# Altium footprint library CONN_DSUB.PcbLib: 35 footprints (part 2 of 3)
Each footprint in its own frame and in the unit in brackets; x right, y up, seen from the top. Pads: shape width x height; smd on the part's side, far side on the other; paste and mask are expansions set on the pad; w line width, h text height; cw(c..) or ccw(c..) is an arc to the next point about the centre after c.
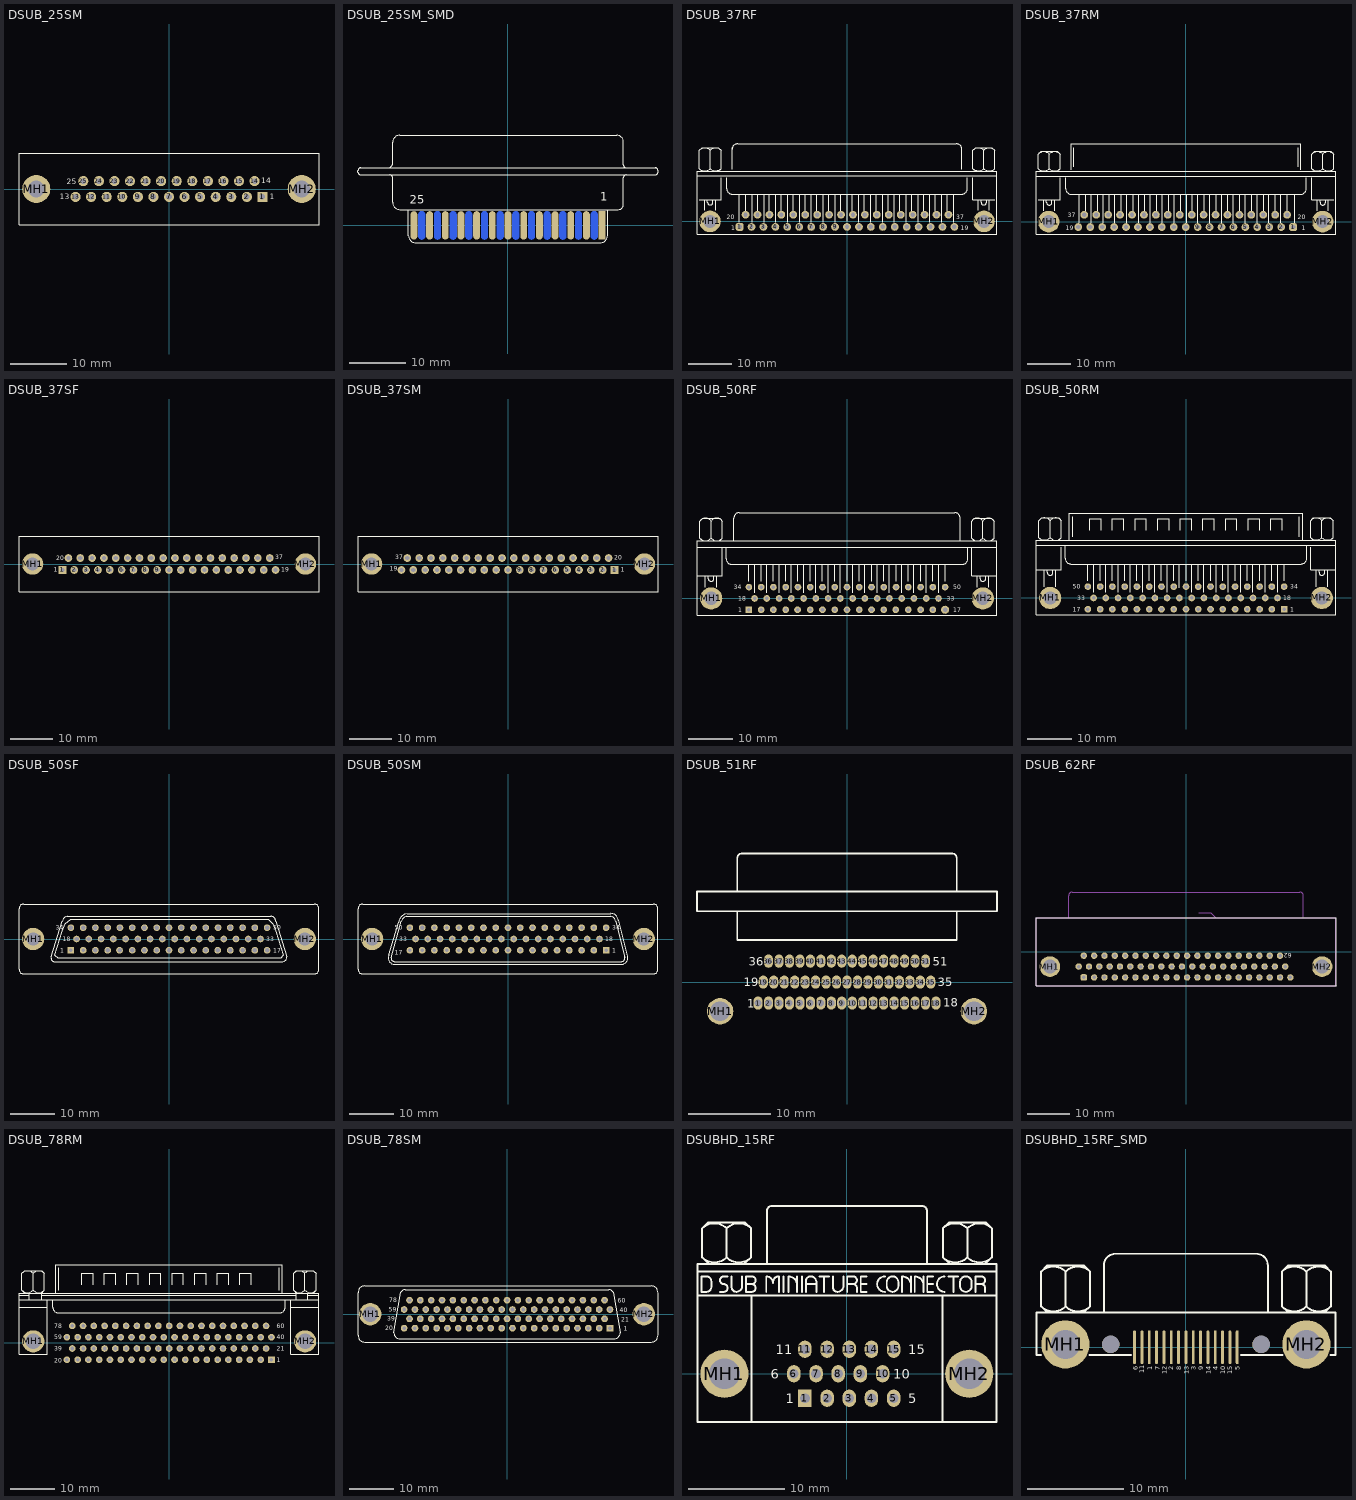
[diagram p1: the footprints below, top view; thin cyan lines are the x and y axes]

## DSUB_25SM [mm] "CONN, DSUB MINIATURE, 25PIN, STRAIGHT, MALE"
pads (27):
  rect 1.8x1.8 hole 1 mask+0.1: 1(16.612,-1.397)
  round 1.8 hole 1 mask+0.1: 2(13.843,-1.397) 3(11.074,-1.397) 4(8.306,-1.397) 5(5.537,-1.397) 6(2.769,-1.397) 7(0,-1.397) 8(-2.769,-1.397) 9(-5.537,-1.397) 10(-8.306,-1.397) 11(-11.074,-1.397) 12(-13.843,-1.397) 13(-16.612,-1.397) 14(15.215,1.397) 15(12.446,1.397) 16(9.677,1.397) 17(6.909,1.397) 18(4.14,1.397) 19(1.372,1.397) 20(-1.397,1.397) 21(-4.166,1.397) 22(-6.934,1.397) 23(-9.703,1.397) 24(-12.471,1.397) 25(-15.24,1.397)
  round 5 hole 3: MH1(-23.597,0) MH2(23.597,0)
Top Overlay:
  lines w0.2: -26.67,-6.35 26.67,-6.35 26.67,6.35 -26.67,6.35 -26.67,-6.35
  text "25" at -18.186,0.889 h1
  text "13" at -19.456,-1.778 h1
  text "1" at 17.882,-1.778 h1
  text "14" at 16.358,1.016 h1
3D body "SW3dPS-DB25plug_straight.STEP": height 12.84, standoff -4.46, extent -26.535,-6.274 26.5,6.274

## DSUB_25SM_SMD [mm] "CONN, DSUB MINIATURE, 25PIN, MALE, STRAIGHT, SURFACE MOUNT"
pads (25):
  rect 1.2x5 smd mask+0.1: 1(16.566,0)
  oval 1.2x5 smd mask+0.1: 2(13.805,0) 3(11.044,0) 4(8.283,0) 5(5.522,0) 6(2.761,0) 7(0,0) 8(-2.761,0) 9(-5.522,0) 10(-8.283,0) 11(-11.044,0) 12(-13.805,0) 13(-16.566,0)
  oval 1.2x5 smd far side mask+0.1: 14(15.186,0) 15(12.425,0) 16(9.664,0) 17(6.903,0) 18(4.142,0) 19(1.381,0) 20(-1.381,0) 21(-4.142,0) 22(-6.902,0) 23(-9.663,0) 24(-12.424,0) 25(-15.185,0)
Top Overlay:
  lines w0.2: -21.59,10.16 22.86,10.16 ; -21.336,8.89 21.59,8.89 ; -17.526,2.794 -17.526,-1.778 ccw(c-16.256,-1.778) -16.256,-3.048 16.256,-3.048 ccw(c16.256,-1.778) 17.526,-1.778 17.526,2.794 ; -26.416,9.398 ccw(c-25.908,9.398) -25.908,8.89 -20.828,8.89 cw(c-20.828,8.382) -20.32,8.382 -20.32,4.064 ccw(c-19.05,4.064) -19.05,2.794 19.453,2.794 ccw(c19.453,3.661) 20.32,3.661 20.32,8.382 cw(c20.828,8.382) 20.828,8.89 25.908,8.89 ccw(c25.908,9.398) 26.416,9.398 26.416,9.652 ccw(c25.908,9.652) 25.908,10.16 20.828,10.16 cw(c20.828,10.668) 20.32,10.668 20.32,14.732 ccw(c19.177,14.732) 19.177,15.875 -19.05,15.875 ccw(c-19.05,14.605) -20.32,14.605 -20.32,10.922 cw(c-21.082,10.922) -21.082,10.16 -25.908,10.16 ccw(c-25.908,9.652) -26.416,9.652 -26.416,9.398
  text "1" at 16.256,4.318 h1.5
  text "25" at -17.272,3.81 h1.5
3D body "SW3dPS-DB25plug_straight.STEP": height 5.51, standoff -7.04, extent -26.518,-1.422 26.518,15.875

## DSUB_37RF [mm] "CONN, DSUB MINIATURE, CONN, DSUB MINIATURE, 37PIN, R/A, FEMALE"
pads (39):
  rrect50% 1.8x1.8 hole 1 mask+0.1: 1(-24.93,-1.27)
  round 1.8 hole 1 mask+0.1: 2(-22.16,-1.27) 3(-19.39,-1.27) 4(-16.62,-1.27) 5(-13.85,-1.27) 6(-11.08,-1.27) 7(-8.31,-1.27) 8(-5.54,-1.27) 9(-2.77,-1.27) 10(0,-1.27) 11(2.77,-1.27) 12(5.54,-1.27) 13(8.31,-1.27) 14(11.08,-1.27) 15(13.85,-1.27) 16(16.62,-1.27) 17(19.39,-1.27) 18(22.16,-1.27) 19(24.93,-1.27) 20(-23.545,1.57) 21(-20.775,1.57) 22(-18.005,1.57) 23(-15.235,1.57) 24(-12.465,1.57) 25(-9.695,1.57) 26(-6.925,1.57) 27(-4.155,1.57) 28(-1.385,1.57) 29(1.385,1.57) 30(4.155,1.57) 31(6.925,1.57) 32(9.695,1.57) 33(12.465,1.57) 34(15.235,1.57) 35(18.005,1.57) 36(20.775,1.57) 37(23.545,1.57)
  round 5 hole 3: MH1(-31.8,0) MH2(31.8,0)
Top Overlay:
  lines w0.2: -34.713,10.583 34.713,10.583 ; -34.292,12.274 ccw(c-33.02,13.547) -31.748,12.274 ; -34.292,16.512 cw(c-33.02,15.24) -31.748,16.512 ; -34.29,5.08 -29.21,5.08 -29.21,10.16 ; -33.655,11.642 -34.29,12.277 -34.29,16.51 -33.655,17.145 -29.845,17.145 -29.21,16.51 -29.21,12.277 -29.845,11.642 ; -33.02,2.54 -33.02,5.08 ; -32.385,5.08 -32.385,4.445 ccw(c-31.75,4.445) -31.115,4.445 -31.115,5.08 ; -31.752,12.274 ccw(c-30.48,13.547) -29.208,12.274 ; -31.752,16.512 cw(c-30.48,15.24) -29.208,16.512 ; -31.75,12.277 -31.75,15.875 -31.75,16.51 ; -30.48,2.54 -30.48,5.08 ; -27.94,10.16 -27.94,7.62 ccw(c-26.67,7.62) -26.67,6.35 26.67,6.35 ccw(c26.67,7.62) 27.94,7.62 27.94,10.16 ; -26.67,12.065 -26.67,17.145 ; -26.67,16.745 cw(c-25.4,16.745) -25.4,18.015 25.4,18.015 cw(c25.4,16.745) 26.67,16.745 ; -24.977,-0.212 -24.977,6.35 ; -23.495,2.328 -23.495,6.35 ; -22.013,-0.212 -22.013,6.138 -22.013,6.35 ; -20.743,2.328 -20.743,6.35 ; -19.262,-0.212 -19.262,6.138 -19.262,6.35 ; -17.992,2.328 -17.992,6.35 ; -16.51,-0.212 -16.51,6.138 -16.51,6.35 ; -15.24,2.328 -15.24,6.35 ; -13.758,-0.212 -13.758,6.138 -13.758,6.35 ; -12.488,2.328 -12.488,6.35 ; -11.007,-0.212 -11.007,6.138 -11.007,6.35 ; -9.737,2.328 -9.737,6.35 ; -8.255,-0.212 -8.255,6.138 -8.255,6.35 ; -6.985,2.328 -6.985,6.35 ; -5.503,-0.212 -5.503,6.138 -5.503,6.35 ; -4.233,2.328 -4.233,6.35 ; -2.752,-0.212 -2.752,6.138 -2.752,6.35 ; -1.482,2.328 -1.482,6.35 ; 0,0 0,6.35 ; 1.27,2.328 1.27,6.35 ; 2.752,-0.212 2.752,6.35 ; 4.022,2.328 4.022,6.35 ; 5.503,-0.212 5.503,6.138 5.503,6.35 ; 6.773,2.328 6.773,6.35 ; 8.255,-0.212 8.255,6.138 8.255,6.35 ; 9.525,2.328 9.525,6.35 ; 11.007,-0.212 11.007,6.138 11.007,6.35 ; 12.277,2.328 12.277,6.35 ; 13.758,-0.212 13.758,6.138 13.758,6.35 ; 15.028,2.328 15.028,6.35 ; 16.51,-0.212 16.51,6.138 16.51,6.35 ; 17.78,2.328 17.78,6.35 ; 19.262,-0.212 19.262,6.138 19.262,6.35 ; 20.532,2.328 20.532,6.35 ; 22.013,-0.212 22.013,6.138 22.013,6.35 ; 23.283,2.328 23.283,6.35 ; 24.765,-0.212 24.765,6.138 24.765,6.35 ; 26.67,12.065 26.67,17.145 ; 29.208,12.274 ccw(c30.48,13.547) 31.752,12.274 ; 29.208,16.512 cw(c30.48,15.24) 31.752,16.512 ; 29.21,10.16 29.21,5.08 34.29,5.08 ; 29.845,11.642 29.21,12.277 29.21,16.51 29.845,17.145 33.655,17.145 34.29,16.51 34.29,12.277 33.655,11.642 ; 30.48,2.54 30.48,5.08 ; 31.115,5.08 31.115,4.445 ccw(c31.75,4.445) 32.385,4.445 32.385,5.08 ; 31.748,12.274 ccw(c33.02,13.547) 34.292,12.274 ; 31.748,16.512 cw(c33.02,15.24) 34.292,16.512 ; 31.75,12.277 31.75,15.875 31.75,16.51 ; 33.02,2.54 33.02,5.08 ; -34.713,-2.963 34.713,-2.963 34.713,11.642 -34.713,11.642 -34.713,-2.963
  text "19" at 26.416,-2.032 h1
  text "37" at 25.4,0.508 h1
  text "20" at -27.94,0.508 h1
  text "1" at -26.924,-2.032 h1
3D body "connector_a-dSUB37RF_a_kg-t1.stp": height 12.57, standoff -4.3, extent -34.66,-2.9 34.66,17.9

## DSUB_37RM [mm] "CONN, DSUB MINIATURE, 37PIN, R/A, MALE"
pads (39):
  rrect50% 1.8x1.8 hole 1 mask+0.1: 1(24.93,-1.27)
  round 1.8 hole 1 mask+0.1: 2(22.16,-1.27) 3(19.39,-1.27) 4(16.62,-1.27) 5(13.85,-1.27) 6(11.08,-1.27) 7(8.31,-1.27) 8(5.54,-1.27) 9(2.77,-1.27) 10(0,-1.27) 11(-2.77,-1.27) 12(-5.54,-1.27) 13(-8.31,-1.27) 14(-11.08,-1.27) 15(-13.85,-1.27) 16(-16.62,-1.27) 17(-19.39,-1.27) 18(-22.16,-1.27) 19(-24.93,-1.27) 20(23.545,1.57) 21(20.775,1.57) 22(18.005,1.57) 23(15.235,1.57) 24(12.465,1.57) 25(9.695,1.57) 26(6.925,1.57) 27(4.155,1.57) 28(1.385,1.57) 29(-1.385,1.57) 30(-4.155,1.57) 31(-6.925,1.57) 32(-9.695,1.57) 33(-12.465,1.57) 34(-15.235,1.57) 35(-18.005,1.57) 36(-20.775,1.57) 37(-23.545,1.57)
  round 5 hole 3: MH1(-31.8,0) MH2(31.8,0)
Top Overlay:
  lines w0.2: -34.646,10.583 34.781,10.583 ; -34.224,12.274 ccw(c-32.952,13.547) -31.68,12.274 ; -34.224,15.666 cw(c-32.952,14.393) -31.68,15.666 ; -34.222,5.08 -29.142,5.08 -29.142,10.16 ; -33.587,11.642 -34.222,12.277 -34.222,12.488 -34.222,15.663 -33.587,16.298 -29.777,16.298 -29.142,15.663 -29.142,15.452 -29.142,12.277 -29.777,11.642 ; -32.952,2.54 -32.952,5.08 ; -32.317,5.08 -32.317,4.445 ccw(c-31.682,4.445) -31.047,4.445 -31.047,5.08 ; -31.684,12.274 ccw(c-30.412,13.547) -29.14,12.274 ; -31.684,15.666 cw(c-30.412,14.393) -29.14,15.666 ; -31.682,12.277 -31.682,15.663 ; -30.412,2.54 -30.412,5.08 ; -27.872,10.16 -27.872,7.62 ccw(c-26.602,7.62) -26.602,6.35 26.738,6.35 ccw(c26.738,7.62) 28.008,7.62 28.008,10.16 ; -26.602,12.065 -26.602,18.1 26.738,18.1 26.738,12.065 ; -25.967,12.7 -25.967,17.145 ; -24.697,-0.212 -24.697,6.35 ; -23.216,2.328 -23.216,6.35 ; -21.946,-0.212 -21.946,6.35 ; -20.464,2.328 -20.464,6.35 ; -19.194,-0.212 -19.194,6.35 ; -17.712,2.328 -17.712,6.35 ; -16.442,-0.212 -16.442,6.35 ; -14.961,2.328 -14.961,6.35 ; -13.691,-0.212 -13.691,6.35 ; -12.209,2.328 -12.209,6.35 ; -10.939,-0.212 -10.939,6.35 ; -9.457,2.328 -9.457,6.35 ; -8.187,-0.212 -8.187,6.35 ; -6.706,2.328 -6.706,6.35 ; -5.436,-0.212 -5.436,6.35 ; -3.954,2.328 -3.954,6.35 ; -2.684,-0.212 -2.684,6.35 ; -1.202,2.328 -1.202,6.35 ; 0.279,-0.212 0.279,6.35 ; 1.549,2.328 1.549,6.35 ; 2.819,-0.212 2.819,6.35 ; 4.301,2.328 4.301,6.35 ; 5.571,-0.212 5.571,6.35 ; 7.053,2.328 7.053,6.35 ; 8.323,-0.212 8.323,6.35 ; 9.804,2.328 9.804,6.35 ; 11.074,-0.212 11.074,6.35 ; 12.556,2.328 12.556,6.35 ; 13.826,-0.212 13.826,6.35 ; 15.308,2.328 15.308,6.35 ; 16.578,-0.212 16.578,6.35 ; 18.059,2.328 18.059,6.35 ; 19.329,-0.212 19.329,6.35 ; 20.811,2.328 20.811,6.35 ; 22.081,-0.212 22.081,6.35 ; 23.563,2.328 23.563,6.35 ; 25.256,-0.212 25.256,6.35 ; 26.103,12.7 26.103,17.145 ; 29.276,12.274 ccw(c30.548,13.547) 31.82,12.274 ; 29.276,15.666 cw(c30.548,14.393) 31.82,15.666 ; 29.278,10.16 29.278,5.08 34.358,5.08 ; 29.913,11.642 29.278,12.277 29.278,12.488 29.278,15.663 29.913,16.298 33.723,16.298 34.358,15.663 34.358,12.277 33.723,11.642 ; 30.548,2.54 30.548,5.08 ; 31.183,5.08 31.183,4.445 ccw(c31.818,4.445) 32.453,4.445 32.453,5.08 ; 31.816,12.274 ccw(c33.088,13.547) 34.36,12.274 ; 31.816,15.666 cw(c33.088,14.393) 34.36,15.666 ; 31.818,12.277 31.818,15.663 ; 33.088,2.54 33.088,5.08 ; -34.646,-2.963 -34.646,11.642 34.781,11.642 34.781,-2.963 -34.646,-2.963
  text "37" at -27.364,1.016 h1
  text "19" at -27.872,-2.032 h1
  text "1" at 26.992,-2.032 h1
  text "20" at 25.976,0.508 h1
3D body "connector_a-DSUB37RM_a_kg-t1.stp": height 12.57, standoff -4.3, extent -34.66,-2.9 34.66,18

## DSUB_37SF [mm] "CONN, DSUB MINIATURE, 37PIN, STRAIGHT, FEMALE"
pads (39):
  rect 1.8x1.8 hole 1 mask+0.1: 1(-24.917,-1.397)
  round 1.8 hole 1 mask+0.1: 2(-22.149,-1.397) 3(-19.38,-1.397) 4(-16.612,-1.397) 5(-13.843,-1.397) 6(-11.074,-1.397) 7(-8.306,-1.397) 8(-5.537,-1.397) 9(-2.769,-1.397) 10(0,-1.397) 11(2.769,-1.397) 12(5.537,-1.397) 13(8.306,-1.397) 14(11.074,-1.397) 15(13.843,-1.397) 16(16.612,-1.397) 17(19.38,-1.397) 18(22.149,-1.397) 19(24.917,-1.397) 20(-23.52,1.397) 21(-20.752,1.397) 22(-17.983,1.397) 23(-15.215,1.397) 24(-12.446,1.397) 25(-9.677,1.397) 26(-6.909,1.397) 27(-4.14,1.397) 28(-1.372,1.397) 29(1.397,1.397) 30(4.166,1.397) 31(6.934,1.397) 32(9.703,1.397) 33(12.471,1.397) 34(15.24,1.397) 35(18.009,1.397) 36(20.777,1.397) 37(23.546,1.397)
  round 5 hole 3: MH1(-31.902,0) MH2(31.902,0)
Top Overlay:
  lines w0.2: -35.077,-6.477 35.077,-6.477 35.077,6.477 -35.077,6.477 -35.077,-6.477
  text "1" at -26.949,-1.778 h1
  text "19" at 26.264,-1.778 h1
  text "37" at 24.867,1.143 h1
  text "20" at -26.314,0.889 h1

## DSUB_37SM [mm] "CONN, DSUB MINIATURE, 37PIN, STRAIGHT, MALE"
pads (39):
  rect 1.8x1.8 hole 1 mask+0.1: 1(24.917,-1.397)
  round 1.8 hole 1 mask+0.1: 2(22.149,-1.397) 3(19.38,-1.397) 4(16.612,-1.397) 5(13.843,-1.397) 6(11.074,-1.397) 7(8.306,-1.397) 8(5.537,-1.397) 9(2.769,-1.397) 10(0,-1.397) 11(-2.769,-1.397) 12(-5.537,-1.397) 13(-8.306,-1.397) 14(-11.074,-1.397) 15(-13.843,-1.397) 16(-16.612,-1.397) 17(-19.38,-1.397) 18(-22.149,-1.397) 19(-24.917,-1.397) 20(23.52,1.397) 21(20.752,1.397) 22(17.983,1.397) 23(15.215,1.397) 24(12.446,1.397) 25(9.677,1.397) 26(6.909,1.397) 27(4.14,1.397) 28(1.372,1.397) 29(-1.397,1.397) 30(-4.166,1.397) 31(-6.934,1.397) 32(-9.703,1.397) 33(-12.471,1.397) 34(-15.24,1.397) 35(-18.009,1.397) 36(-20.777,1.397) 37(-23.546,1.397)
  round 5 hole 3: MH1(-31.902,0) MH2(31.902,0)
Top Overlay:
  lines w0.2: -35.077,-6.477 -35.077,6.477 35.077,6.477 35.077,-6.477 -35.077,-6.477
  text "20" at 24.79,1.016 h1
  text "37" at -26.391,1.143 h1
  text "19" at -27.661,-1.524 h1
  text "1" at 26.314,-1.778 h1

## DSUB_50RF [mm] "CONN, DSUB MINIATURE, 50PIN, R/A, FEMALE"
pads (52):
  rect 1.5x1.5 hole 0.8: 1(-22.013,-2.54)
  round 1.5 hole 0.8: 2(-19.262,-2.54) 3(-16.51,-2.54) 4(-13.758,-2.54) 5(-11.091,-2.54) 6(-8.255,-2.54) 7(-5.503,-2.54) 8(-2.752,-2.54) 9(0,-2.54) 10(2.752,-2.54) 11(5.503,-2.54) 12(8.255,-2.54) 13(10.922,-2.54) 14(13.758,-2.54) 15(16.51,-2.54) 16(19.262,-2.54) 18(-20.743,0) 19(-17.992,0) 20(-15.24,0) 21(-12.488,0) 22(-9.737,0) 23(-6.985,0) 24(-4.233,0) 25(-1.482,0) 26(1.27,0) 27(4.022,0) 28(6.773,0) 29(9.525,0) 30(12.277,0) 31(15.028,0) 32(17.78,0) 33(20.532,0) 34(-22.013,2.54) 35(-19.262,2.54) 36(-16.51,2.54) 37(-13.758,2.54) 38(-11.007,2.54) 39(-8.255,2.54) 40(-5.503,2.54) 41(-2.752,2.54) 42(0,2.54) 43(2.752,2.54) 44(5.503,2.54) 45(8.255,2.54) 46(11.007,2.54) 47(13.758,2.54) 48(16.51,2.54) 49(19.262,2.54) 50(22.013,2.54)
  round 1.8 hole 1 mask+0.1: 17(22.013,-2.54)
  round 5 hole 3: MH1(-30.48,0) MH2(30.48,0)
Top Overlay:
  lines w0.2: -33.655,5.08 -27.94,5.08 -27.94,11.43 ; -33.655,11.43 33.655,11.43 ; -33.015,13.544 ccw(c-31.75,14.605) -30.485,13.544 ; -33.013,17.362 cw(c-31.75,16.51) -30.487,17.362 ; -32.385,12.912 -33.02,13.547 -33.02,17.357 -32.385,17.992 -28.575,17.992 -27.94,17.357 -27.94,13.547 -28.575,12.912 ; -31.75,2.54 -31.75,5.08 ; -31.115,5.08 -31.115,4.445 ccw(c-30.48,4.445) -29.845,4.445 -29.845,5.08 ; -30.48,13.547 -30.48,17.357 ; -30.475,13.544 ccw(c-29.21,14.605) -27.945,13.544 ; -30.473,17.362 cw(c-29.21,16.51) -27.947,17.362 ; -29.21,2.54 -29.21,5.08 ; -27.093,11.218 -27.093,8.89 ccw(c-25.823,8.89) -25.823,7.62 25.823,7.62 ccw(c25.823,8.89) 27.093,8.89 27.093,11.218 ; -25.4,12.912 -25.4,17.992 cw(c-24.13,17.992) -24.13,19.262 24.13,19.262 cw(c24.13,17.992) 25.4,17.992 25.4,12.912 ; -22.013,3.81 -22.013,7.62 ; -20.743,1.27 -20.743,7.62 ; -19.262,3.81 -19.262,7.62 ; -17.992,1.27 -17.992,7.62 ; -16.51,3.81 -16.51,7.62 ; -15.24,1.27 -15.24,7.62 ; -13.758,3.81 -13.758,7.62 ; -12.488,1.27 -12.488,7.62 ; -11.007,3.81 -11.007,7.62 ; -9.737,1.27 -9.737,7.62 ; -8.255,3.81 -8.255,7.62 ; -6.985,1.27 -6.985,7.62 ; -5.503,3.81 -5.503,7.62 ; -4.233,1.27 -4.233,7.62 ; -2.752,3.81 -2.752,7.62 ; -1.482,1.27 -1.482,7.62 ; 0,3.81 0,7.62 ; 1.27,1.693 1.27,1.27 1.27,7.62 ; 2.752,3.81 2.752,7.62 ; 4.022,1.27 4.022,7.62 ; 5.503,3.81 5.503,7.62 ; 6.773,1.27 6.773,7.62 ; 8.255,3.81 8.255,7.62 ; 9.525,1.27 9.525,7.62 ; 11.007,3.81 11.007,7.62 ; 12.277,1.27 12.277,7.62 ; 13.758,3.81 13.758,7.62 ; 15.028,1.27 15.028,7.62 ; 16.51,3.81 16.51,7.62 ; 17.78,1.27 17.78,7.62 ; 19.262,3.81 19.262,7.62 ; 20.532,1.27 20.532,7.62 ; 22.013,3.81 22.013,7.62 ; 27.94,11.43 27.94,5.08 33.655,5.08 ; 27.945,13.544 ccw(c29.21,14.605) 30.475,13.544 ; 27.947,17.362 cw(c29.21,16.51) 30.473,17.362 ; 28.575,12.912 27.94,13.547 27.94,17.357 28.575,17.992 32.385,17.992 33.02,17.357 33.02,13.547 32.385,12.912 ; 29.21,2.54 29.21,5.08 ; 29.845,5.08 29.845,4.445 ccw(c30.48,4.445) 31.115,4.445 31.115,5.08 ; 30.48,13.547 30.48,17.357 ; 30.485,13.544 ccw(c31.75,14.605) 33.015,13.544 ; 30.487,17.362 cw(c31.75,16.51) 33.013,17.362 ; 31.75,2.54 31.75,5.08 ; -33.655,-3.81 33.655,-3.81 33.655,12.912 -33.655,12.912 -33.655,-3.81
  text "34" at -25.4,2.032 h1
  text "50" at 23.876,2.032 h1
  text "33" at 22.352,-0.508 h1
  text "17" at 23.876,-3.048 h1
  text "1" at -24.384,-3.048 h1
  text "18" at -24.384,-0.508 h1

## DSUB_50RM [mm] "CONN, DSUB MINIATURE, 50PIN, R/A, MALE"
pads (52):
  rect 1.5x1.5 hole 0.8: 1(22.013,-2.54)
  round 1.5 hole 0.8: 2(19.262,-2.54) 3(16.51,-2.54) 4(13.758,-2.54) 5(11.007,-2.54) 6(8.255,-2.54) 7(5.503,-2.54) 8(2.752,-2.54) 9(0,-2.54) 10(-2.752,-2.54) 11(-5.503,-2.54) 12(-8.255,-2.54) 13(-11.007,-2.54) 14(-13.758,-2.54) 15(-16.51,-2.54) 16(-19.262,-2.54) 17(-22.013,-2.54) 18(20.532,0) 19(17.78,0) 20(15.028,0) 21(12.277,0) 22(9.525,0) 23(6.773,0) 24(4.022,0) 25(1.27,0) 26(-1.482,0) 27(-4.233,0) 28(-6.985,0) 29(-9.737,0) 30(-12.488,0) 31(-15.24,0) 32(-17.992,0) 33(-20.743,0) 34(22.013,2.54) 35(19.262,2.54) 36(16.51,2.54) 37(13.758,2.54) 38(11.007,2.54) 39(8.255,2.54) 40(5.503,2.54) 41(2.752,2.54) 42(0,2.54) 43(-2.752,2.54) 44(-5.503,2.54) 45(-8.255,2.54) 46(-11.007,2.54) 47(-13.758,2.54) 48(-16.51,2.54) 49(-19.262,2.54) 50(-22.013,2.54)
  round 5 hole 3: MH1(-30.48,0) MH2(30.48,0)
Top Overlay:
  lines w0.2: -33.655,6.35 -27.94,6.35 -27.94,11.43 ; -33.655,11.853 33.655,11.853 ; -33.022,13.544 ccw(c-31.75,14.817) -30.478,13.544 ; -33.015,17.36 cw(c-31.75,16.298) -30.485,17.36 ; -32.385,12.912 -33.02,13.547 -33.02,17.357 -32.385,17.992 -28.575,17.992 -27.94,17.357 -27.94,13.547 -28.575,12.912 ; -31.75,2.54 -31.75,6.35 ; -31.115,6.35 -31.115,5.715 ccw(c-30.48,5.715) -29.845,5.715 -29.845,6.35 ; -30.48,13.547 -30.48,17.357 ; -30.475,13.544 ccw(c-29.21,14.605) -27.945,13.544 ; -30.475,17.36 cw(c-29.21,16.298) -27.945,17.36 ; -29.21,2.54 -29.21,6.35 ; -27.093,11.853 -27.093,8.89 ccw(c-25.823,8.89) -25.823,7.62 25.823,7.62 ccw(c25.823,8.89) 27.093,8.89 27.093,11.853 ; -26.247,12.912 -26.247,19.05 26.247,19.05 26.247,12.912 ; -25.4,13.758 -25.4,18.203 ; -22.013,3.81 -22.013,7.62 ; -21.59,15.24 -21.59,17.78 -19.05,17.78 -19.05,15.24 ; -20.743,1.27 -20.743,7.62 ; -19.262,3.81 -19.262,7.62 ; -17.992,1.27 -17.992,7.62 ; -16.51,3.81 -16.51,7.62 ; -16.51,15.24 -16.51,17.78 -13.97,17.78 -13.97,15.24 ; -15.24,1.27 -15.24,7.62 ; -13.758,3.81 -13.758,7.62 ; -12.488,1.27 -12.488,7.62 ; -11.43,15.24 -11.43,17.78 -8.89,17.78 -8.89,15.24 ; -11.007,3.81 -11.007,7.62 ; -9.737,1.27 -9.737,7.62 ; -8.255,3.81 -8.255,7.62 ; -6.985,1.27 -6.985,7.62 ; -6.35,15.24 -6.35,17.78 -3.81,17.78 -3.81,15.24 ; -5.503,3.81 -5.503,7.62 ; -4.233,1.27 -4.233,7.62 ; -2.752,3.81 -2.752,7.62 ; -1.482,2.328 -1.482,7.62 ; -1.27,15.24 -1.27,17.78 1.27,17.78 1.27,15.24 ; 0,3.81 0,7.62 ; 1.27,1.27 1.27,7.62 ; 2.752,3.81 2.752,7.62 ; 3.81,15.24 3.81,17.78 6.35,17.78 6.35,15.24 ; 4.022,1.27 4.022,7.62 ; 5.503,3.81 5.503,7.62 ; 6.773,1.27 6.773,7.62 ; 8.255,3.81 8.255,7.62 ; 8.89,15.24 8.89,17.78 11.43,17.78 11.43,15.24 ; 9.525,1.27 9.525,7.62 ; 11.007,3.81 11.007,7.62 ; 12.277,1.27 12.277,7.62 ; 13.758,3.81 13.758,7.62 ; 13.97,15.24 13.97,17.78 16.51,17.78 16.51,15.24 ; 15.028,1.27 15.028,7.62 ; 16.51,3.81 16.51,7.62 ; 17.78,1.27 17.78,7.62 ; 19.05,15.24 19.05,17.78 21.59,17.78 21.59,15.24 ; 19.262,3.81 19.262,7.62 ; 20.532,1.27 20.532,7.62 ; 22.013,3.81 22.013,7.62 ; 25.4,13.758 25.4,18.203 ; 27.938,13.544 ccw(c29.21,14.817) 30.482,13.544 ; 27.938,17.359 cw(c29.21,16.087) 30.482,17.359 ; 27.94,11.43 27.94,6.35 33.655,6.35 ; 28.575,12.912 28.363,13.123 27.94,13.547 27.94,17.357 28.575,17.992 32.385,17.992 33.02,17.357 33.02,13.547 32.385,12.912 ; 29.21,2.54 29.21,6.35 ; 29.845,6.35 29.845,5.715 ccw(c30.48,5.715) 31.115,5.715 31.115,6.35 ; 30.478,13.544 ccw(c31.75,14.817) 33.022,13.544 ; 30.478,17.359 cw(c31.75,16.087) 33.022,17.359 ; 30.48,13.547 30.48,17.357 ; 31.75,2.54 31.75,6.35 ; -33.655,-3.81 -33.655,12.912 33.655,12.912 33.655,-3.81 -33.655,-3.81
  text "50" at -25.4,2.032 h1
  text "33" at -24.384,-0.508 h1
  text "17" at -25.4,-3.048 h1
  text "1" at 23.368,-3.048 h1
  text "18" at 21.844,-0.508 h1
  text "34" at 23.368,2.032 h1

## DSUB_50SF [mm] "CONN, DSUB MINIATURE, 50PIN, STRAIGHT, FEMALE"
pads (52):
  rect 1.5x1.5 hole 0.8: 1(-22.013,-2.54)
  round 1.5 hole 0.8: 2(-19.262,-2.54)
  round 1.5 hole 1: 3(-16.51,-2.54) 4(-13.758,-2.54) 5(-11.091,-2.54) 6(-8.255,-2.54) 7(-5.503,-2.54) 8(-2.752,-2.54) 9(0,-2.54) 10(2.752,-2.54) 11(5.503,-2.54) 12(8.255,-2.54) 13(10.922,-2.54) 14(13.758,-2.54) 15(16.51,-2.54) 16(19.262,-2.54) 17(22.013,-2.54) 18(-20.743,0) 19(-17.992,0) 20(-15.24,0) 21(-12.488,0) 22(-9.737,0) 23(-6.985,0) 24(-4.233,0) 25(-1.482,0) 26(1.27,0) 27(4.022,0) 28(6.773,0) 29(9.525,0) 30(12.277,0) 31(15.028,0) 32(17.78,0) 33(20.532,0) 34(-22.013,2.54) 35(-19.262,2.54) 36(-16.51,2.54) 37(-13.758,2.54) 38(-11.007,2.54) 39(-8.255,2.54) 40(-5.503,2.54) 41(-2.752,2.54) 42(0,2.54) 43(2.752,2.54) 44(5.503,2.54) 45(8.255,2.54) 46(11.007,2.54) 47(13.758,2.54) 48(16.51,2.54) 49(19.262,2.54) 50(22.013,2.54)
  round 5 hole 3: MH1(-30.48,0) MH2(30.48,0)
Top Overlay:
  lines w0.2: -26.458,-4.022 -23.918,4.022 ; -26.454,-4.023 ccw(c-25.612,-4.233) -25.402,-5.075 ; -25.4,-5.08 25.4,-5.08 ccw(c25.4,-4.022) 26.458,-4.022 23.918,4.022 ccw(c22.86,4.022) 22.86,5.08 -22.86,5.08 ; -23.924,4.012 cw(c-22.648,3.81) -22.85,5.085 ; -33.655,-6.773 ccw(c-32.597,-6.773) -32.597,-7.832 32.597,-7.832 ccw(c32.597,-6.773) 33.655,-6.773 33.655,6.773 ccw(c32.597,6.773) 32.597,7.832 -32.597,7.832 ccw(c-32.597,6.773) -33.655,6.773 -33.655,-6.773 ; -25.612,-3.598 -24.977,-4.233 25.188,-4.233 25.612,-3.598 23.918,1.693 23.283,3.387 22.225,4.445 -22.013,4.445 -23.283,3.387 -23.918,1.693 -25.612,-3.598
  text "34" at -25.4,2.032 h1
  text "18" at -23.876,-0.508 h1
  text "1" at -24.384,-3.048 h1
  text "17" at 23.368,-3.048 h1
  text "33" at 21.844,-0.508 h1
  text "50" at 23.368,2.032 h1

## DSUB_50SM [mm] "CONN, DSUB MINIATURE, 50PIN, STRAIGHT, MALE"
pads (52):
  rect 1.5x1.5 hole 0.8: 1(22.013,-2.54)
  round 1.5 hole 0.8: 2(19.262,-2.54) 3(16.51,-2.54) 4(13.758,-2.54) 5(11.007,-2.54) 6(8.255,-2.54) 7(5.503,-2.54) 8(2.752,-2.54) 9(0,-2.54) 10(-2.752,-2.54) 11(-5.503,-2.54) 12(-8.255,-2.54) 13(-11.007,-2.54) 14(-13.758,-2.54) 15(-16.51,-2.54) 16(-19.262,-2.54) 17(-22.013,-2.54) 18(20.532,0) 19(17.78,0) 20(15.028,0) 21(12.277,0) 22(9.525,0) 23(6.773,0) 24(4.022,0) 25(1.27,0) 26(-1.482,0) 27(-4.233,0) 28(-6.985,0) 29(-9.737,0) 30(-12.488,0) 31(-15.24,0) 32(-17.992,0) 33(-20.743,0) 34(22.013,2.54) 35(19.262,2.54) 36(16.51,2.54) 37(13.758,2.54) 38(11.007,2.54) 39(8.255,2.54) 40(5.503,2.54) 41(2.752,2.54) 42(0,2.54) 43(-2.752,2.54) 44(-5.503,2.54) 45(-8.255,2.54) 46(-11.007,2.54) 47(-13.758,2.54) 48(-16.51,2.54) 50(-22.013,2.54)
  round 1.5 hole 1: 49(-19.262,2.54)
  round 5 hole 3: MH1(-30.48,0) MH2(30.48,0)
Top Overlay:
  lines w0.2: -26.755,-3.598 -24.553,3.81 ; -26.72,-3.561 ccw(c-25.4,-4.233) -25.4,-5.715 25.4,-5.715 ccw(c25.4,-4.233) 26.824,-3.825 ; -24.56,3.798 cw(c-22.225,3.387) -22.839,5.677 ; -23.918,4.022 -26.247,-4.233 ccw(c-25.4,-4.233) -25.4,-5.08 25.4,-5.08 ccw(c25.4,-4.233) 26.205,-3.972 ; -23.905,4.031 cw(c-22.225,3.387) -22.87,5.066 ; -22.86,5.08 23.072,5.08 ; -22.648,5.715 23.072,5.715 ; 23.062,5.085 cw(c22.86,3.81) 24.135,4.012 ; 23.072,5.736 cw(c23.072,4.022) 24.773,4.231 ; 24.13,4.022 26.247,-4.233 ; 24.765,4.233 26.797,-3.852 ; -33.655,-6.773 ccw(c-32.597,-6.773) -32.597,-7.832 32.597,-7.832 ccw(c32.597,-6.773) 33.655,-6.773 33.655,6.773 ccw(c32.597,6.773) 32.597,7.832 -32.597,7.832 ccw(c-32.597,6.773) -33.655,6.773 -33.655,-6.773
  text "50" at -25.4,2.032 h1
  text "33" at -24.384,-0.508 h1
  text "17" at -25.4,-3.556 h1
  text "1" at 23.368,-3.048 h1
  text "18" at 21.844,-0.508 h1
  text "34" at 23.368,2.032 h1

## DSUB_51RF [mm] "CONN, DSUB MINIATURE, 51PIN, R/A, FEMALE, J30J-51ZKW-J"
pads (53):
  oval 1.1x1.6 hole 0.8 mask+0.075: 1(-10.795,-2.54) 2(-9.525,-2.54) 3(-8.255,-2.54) 4(-6.985,-2.54) 5(-5.715,-2.54) 6(-4.445,-2.54) 7(-3.175,-2.54) 8(-1.905,-2.54) 9(-0.635,-2.54) 10(0.635,-2.54) 11(1.905,-2.54) 12(3.175,-2.54) 13(4.445,-2.54) 14(5.715,-2.54) 15(6.985,-2.54) 16(8.255,-2.54) 17(9.525,-2.54) 18(10.795,-2.54) 19(-10.16,0) 20(-8.89,0) 21(-7.62,0) 22(-6.35,0) 23(-5.08,0) 24(-3.81,0) 25(-2.54,0) 26(-1.27,0) 27(0,0) 28(1.27,0) 29(2.54,0) 30(3.81,0) 31(5.08,0) 32(6.35,0) 33(7.62,0) 34(8.89,0) 35(10.16,0) 36(-9.525,2.54) 37(-8.255,2.54) 38(-6.985,2.54) 39(-5.715,2.54) 40(-4.445,2.54) 41(-3.175,2.54) 42(-1.905,2.54) 43(-0.635,2.54) 44(0.635,2.54) 45(1.905,2.54) 46(3.175,2.54) 47(4.445,2.54) 48(5.715,2.54) 49(6.985,2.54) 50(8.255,2.54) 51(9.525,2.54)
  round 3.2 hole 2.4: MH1(-15.4,-3.54) MH2(15.4,-3.54)
Top Overlay:
  lines w0.2: -13.3,8.6 -13.3,5.1 13.3,5.1 13.3,8.6 ; -13.3,11 -13.3,15.1 cw(c-12.8,15.1) -12.8,15.6 12.8,15.6 cw(c12.8,15.1) 13.3,15.1 13.3,11 ; -18.2,8.6 -18.2,11 18.2,11 18.2,8.6 -18.2,8.6
  text "19" at -12.5,-0.5 h1
  text "1" at -12.1,-3.1 h1
  text "18" at 11.7,-3 h1
  text "35" at 11,-0.5 h1
  text "51" at 10.4,2 h1
  text "36" at -11.9,2 h1

## DSUB_62RF [mm] "62 pins, right angled with Rivet, WE 618062325223"
height 12.5
pads (64):
  rrect50% 1.5x1.5 hole 0.8: 1(-23.846,-6.02)
  round 1.5 hole 0.8: 2(-21.436,-6.02) 3(-19.026,-6.02) 4(-16.616,-6.02) 5(-14.206,-6.02) 6(-11.796,-6.02) 7(-9.386,-6.02) 8(-6.976,-6.02) 9(-4.566,-6.02) 10(-2.156,-6.02) 11(0.254,-6.02) 12(2.664,-6.02) 13(5.074,-6.02) 14(7.484,-6.02) 15(9.894,-6.02) 16(12.304,-6.02) 17(14.714,-6.02) 18(17.124,-6.02) 19(19.534,-6.02) 20(21.944,-6.02) 21(24.354,-6.02) 22(-25.046,-3.48) 23(-22.636,-3.48) 24(-20.226,-3.48) 25(-17.816,-3.48) 26(-15.406,-3.48) 27(-12.996,-3.48) 28(-10.586,-3.48) 29(-8.176,-3.48) 30(-5.766,-3.48) 31(-3.356,-3.48) 32(-0.946,-3.48) 33(1.464,-3.48) 34(3.874,-3.48) 35(6.284,-3.48) 36(8.694,-3.48) 37(11.104,-3.48) 38(13.514,-3.48) 39(15.924,-3.48) 40(18.334,-3.48) 41(20.744,-3.48) 42(23.154,-3.48) 43(-23.846,-0.94) 44(-21.436,-0.94) 45(-19.026,-0.94) 46(-16.616,-0.94) 47(-14.206,-0.94) 48(-11.796,-0.94) 49(-9.386,-0.94) 50(-6.976,-0.94) 51(-4.566,-0.94) 52(-2.156,-0.94) 53(0.254,-0.94) 54(2.664,-0.94) 55(5.074,-0.94) 56(7.484,-0.94) 57(9.894,-0.94) 58(12.304,-0.94) 59(14.714,-0.94) 60(17.124,-0.94) 61(19.534,-0.94) 62(21.944,-0.94)
  round 4.8 hole 3.2: MH1(-31.75,-3.48) MH2(31.75,-3.48)
Top Overlay:
  lines w0.2: -35,-7.95 -35,7.95 35,7.95 35,-7.95 -35,-7.95
  text "62" at 24.71,-0.4 h1.02
Mechanical 2:
  lines w0.2: -34.7,7.95 34.7,7.95
Mechanical 13:
  lines w0.1: 34.997,-7.95 34.997,7.95 -35,7.95 -35,-7.95 35,-7.95 ; -27.4,13.05 cw(c-26.6,13.05) -26.6,13.85 ; -27.4,13.05 cw(c-26.6,13.05) -26.6,13.85 ; -27.4,13.05 -27.4,7.95 -27.4,13.05 ; -26.6,13.85 26.6,13.85 ; -26.6,13.85 26.6,13.85 ; 26.6,13.85 cw(c26.6,13.05) 27.4,13.05 ; 26.6,13.85 cw(c26.6,13.05) 27.4,13.05 ; 27.4,13.05 27.4,7.95 27.4,13.05
  lines w0.2: 3,9.1 5.75,9.1 6.9,7.95
  text "PCB Edge" at 2.6,9.6 h1.02
3D body "618062325223.stp": height 12.55, standoff -3.9, extent -35.003,-7.95 34.997,13.85

## DSUB_78RM [mm] "CONN, DSUB MINIATURE, CONN, DSUB MINIATURE, 78PIN, R/A, MALE"
pads (80):
  rect 1.5x1.5 hole 0.8: 1(22.99,-3.81)
  round 1.5 hole 0.8: 2(20.57,-3.81) 3(18.15,-3.81) 4(15.73,-3.81) 5(13.31,-3.81) 6(10.89,-3.81) 7(8.47,-3.81) 8(6.05,-3.81) 9(3.63,-3.81) 10(1.21,-3.81) 11(-1.21,-3.81) 12(-3.63,-3.81) 13(-6.05,-3.81) 14(-8.47,-3.81) 15(-10.89,-3.81) 16(-13.31,-3.81) 17(-15.73,-3.81) 18(-18.15,-3.81) 19(-20.57,-3.81) 20(-22.99,-3.81) 21(21.78,-1.27) 22(19.36,-1.27) 23(16.94,-1.27) 24(14.52,-1.27) 25(12.1,-1.27) 26(9.68,-1.27) 27(7.26,-1.27) 28(4.84,-1.27) 29(2.42,-1.27) 30(0,-1.27) 31(-2.42,-1.27) 32(-4.84,-1.27) 33(-7.26,-1.27) 34(-9.68,-1.27) 35(-12.1,-1.27) 36(-14.52,-1.27) 37(-16.94,-1.27) 38(-19.36,-1.27) 39(-21.78,-1.27) 40(22.99,1.27) 41(20.57,1.27) 42(18.15,1.27) 43(15.73,1.27) 44(13.31,1.27) 45(10.89,1.27) 46(8.47,1.27) 47(6.05,1.27) 48(3.63,1.27) 49(1.21,1.27) 50(-1.21,1.27) 51(-3.63,1.27) 52(-6.05,1.27) 53(-8.47,1.27) 54(-10.89,1.27) 55(-13.31,1.27) 56(-15.73,1.27) 57(-18.15,1.27) 58(-20.57,1.27) 59(-22.99,1.27) 60(21.78,3.81) 61(19.36,3.81) 62(16.94,3.81) 63(14.52,3.81) 64(12.1,3.81) 65(9.68,3.81) 66(7.26,3.81) 67(4.84,3.81) 68(2.42,3.81) 69(0,3.81) 70(-2.42,3.81) 71(-4.84,3.81) 72(-7.26,3.81) 73(-9.68,3.81) 74(-12.1,3.81) 75(-14.52,3.81) 76(-16.94,3.81) 77(-19.36,3.81) 78(-21.78,3.81)
  round 5 hole 3.5: MH1(-30.55,0.33) MH2(30.55,0.33)
Top Overlay:
  lines w0.2: -33.758,8.001 -27.408,8.001 ; -33.758,9.694 33.679,9.694 ; -33.758,10.753 -31.429,10.753 ; -33.125,11.809 ccw(c-31.853,13.081) -30.581,11.809 ; -33.125,15.623 cw(c-31.853,14.351) -30.581,15.623 ; -32.488,11.176 -33.123,11.811 -33.123,15.621 -32.488,16.256 -28.678,16.256 -28.043,15.621 -28.043,11.811 -28.678,11.176 -28.678,9.694 ; -31.429,9.694 -31.429,11.176 ; -30.585,11.809 ccw(c-29.313,13.081) -28.041,11.809 ; -30.585,15.623 cw(c-29.313,14.351) -28.041,15.623 ; -30.583,11.811 -30.583,15.621 ; -28.678,10.753 28.599,10.753 ; -27.408,9.694 -27.408,-2.582 -33.758,-2.582 -33.758,11.176 33.679,11.176 33.679,-2.582 27.329,-2.582 27.329,9.694 ; -26.138,9.694 -26.138,8.001 ccw(c-24.868,8.001) -24.868,6.731 24.789,6.731 ccw(c24.789,8.001) 26.059,8.001 26.059,9.694 ; -25.503,11.176 -25.503,17.526 25.424,17.526 25.424,11.176 ; -24.868,11.811 -24.868,16.891 ; -19.661,13.081 -19.661,15.621 -17.121,15.621 -17.121,13.081 ; -14.581,13.081 -14.581,15.621 -12.041,15.621 -12.041,13.081 ; -9.501,13.081 -9.501,15.621 -6.961,15.621 -6.961,13.081 ; -4.421,13.081 -4.421,15.621 -1.881,15.621 -1.881,13.081 ; 0.659,13.081 0.659,15.621 3.199,15.621 3.199,13.081 ; 5.739,13.081 5.739,15.621 8.279,15.621 8.279,13.081 ; 10.819,13.081 10.819,15.621 13.359,15.621 13.359,13.081 ; 15.899,13.081 15.899,15.621 18.439,15.621 18.439,13.081 ; 24.789,11.811 24.789,16.891 ; 27.329,8.001 33.679,8.001 ; 27.962,11.809 ccw(c29.234,13.081) 30.506,11.809 ; 27.962,15.623 cw(c29.234,14.351) 30.506,15.623 ; 28.599,9.694 28.599,11.176 27.964,11.811 27.964,15.621 28.599,16.256 32.409,16.256 33.044,15.621 33.044,11.811 32.409,11.176 ; 30.502,11.809 ccw(c31.774,13.081) 33.046,11.809 ; 30.502,15.623 cw(c31.774,14.351) 33.046,15.623 ; 30.504,11.811 30.504,15.621 ; 31.139,9.694 31.139,11.176 ; 31.139,10.753 33.679,10.753
  text "20" at -25.778,-4.445 h1
  text "39" at -25.778,-1.778 h1
  text "59" at -25.778,0.762 h1
  text "78" at -25.778,3.302 h1
  text "60" at 24.133,3.302 h1
  text "40" at 24.133,0.762 h1
  text "21" at 24.133,-1.778 h1
  text "1" at 24.133,-4.318 h1

## DSUB_78SM [mm] "CONN, DSUB MINIATURE, CONN, DSUB MINIATURE, 78PIN, STRAIGHT, MALE"
pads (80):
  rect 1.5x1.5 hole 0.8: 1(22.99,-3.12)
  round 1.5 hole 0.8: 2(20.57,-3.12) 3(18.15,-3.12) 4(15.73,-3.12) 5(13.31,-3.12) 6(10.89,-3.12) 7(8.47,-3.12) 8(6.05,-3.12) 9(3.63,-3.12) 10(1.21,-3.12) 11(-1.21,-3.12) 12(-3.63,-3.12) 13(-6.05,-3.12) 14(-8.47,-3.12) 15(-10.89,-3.12) 16(-13.31,-3.12) 17(-15.73,-3.12) 18(-18.15,-3.12) 19(-20.57,-3.12) 20(-22.99,-3.12) 21(21.78,-1.04) 22(19.36,-1.04) 23(16.94,-1.04) 24(14.52,-1.04) 25(12.1,-1.04) 26(9.68,-1.04) 27(7.26,-1.04) 28(4.84,-1.04) 29(2.42,-1.04) 30(0,-1.04) 31(-2.42,-1.04) 32(-4.84,-1.04) 33(-7.26,-1.04) 34(-9.68,-1.04) 35(-12.1,-1.04) 36(-14.52,-1.04) 37(-16.94,-1.04) 38(-19.36,-1.04) 39(-21.78,-1.04) 40(22.99,1.04) 41(20.57,1.04) 42(18.15,1.04) 43(15.73,1.04) 44(13.31,1.04) 45(10.89,1.04) 46(8.47,1.04) 47(6.05,1.04) 48(3.63,1.04) 49(1.21,1.04) 50(-1.21,1.04) 51(-3.63,1.04) 52(-6.05,1.04) 53(-8.47,1.04) 54(-10.89,1.04) 55(-13.31,1.04) 56(-15.73,1.04) 57(-18.15,1.04) 58(-20.57,1.04) 59(-22.99,1.04) 60(21.78,3.12) 61(19.36,3.12) 62(16.94,3.12) 63(14.52,3.12) 64(12.1,3.12) 65(9.68,3.12) 66(7.26,3.12) 67(4.84,3.12) 68(2.42,3.12) 69(0,3.12) 70(-2.42,3.12) 71(-4.84,3.12) 72(-7.26,3.12) 73(-9.68,3.12) 74(-12.1,3.12) 75(-14.52,3.12) 76(-16.94,3.12) 77(-19.36,3.12) 78(-21.78,3.12)
  round 5 hole 3.5: MH1(-30.55,0) MH2(30.55,0)
Top Overlay:
  lines w0.2: -22.744,5.5 ccw(c-22.744,4.364) -23.756,4.879 -25.281,-4.103 ccw(c-23.878,-4.103) -24,-5.5 24,-5.5 ccw(c23.878,-4.103) 25.281,-4.103 23.749,4.879 ccw(c22.737,4.364) 22.737,5.5 ; -22.744,5.5 22.737,5.5 ; 33.712,-4.701 cw(c32.188,-4.701) 32.188,-6.225 -31.764,-6.225 cw(c-31.764,-4.701) -33.288,-4.701 -33.288,4.774 cw(c-31.764,4.774) -31.764,6.298 32.188,6.298 cw(c32.188,4.774) 33.712,4.774 ; 33.712,-4.701 33.712,4.774 ; 33.712,-4.701 33.712,4.774
  text "20" at -27.178,-3.556 h1
  text "39" at -26.797,-1.524 h1
  text "59" at -26.416,0.508 h1
  text "78" at -26.289,2.667 h1
  text "60" at 24.765,2.54 h1
  text "40" at 25.146,0.381 h1
  text "21" at 25.527,-1.651 h1
  text "1" at 26.035,-3.683 h1

## DSUBHD_15RF [mm] "CONN, DSUB MINIATURE, HIGH DENSITY 15p, RightAngle, Female, VGA"
pads (17):
  rect 1.4x1.8 hole 1: 1(-4.35,-2.54)
  oval 1.4x1.8 hole 1: 2(-2.05,-2.54) 3(0.25,-2.54) 4(2.55,-2.54) 5(4.85,-2.54) 6(-5.5,0) 7(-3.2,0) 8(-0.9,0) 9(1.4,0) 10(3.7,0) 11(-4.35,2.54) 12(-2.05,2.54) 13(0.25,2.54) 14(2.55,2.54) 15(4.85,2.54)
  round 5 hole 3.2: MH1(-12.7,0) MH2(12.7,0)
Top Overlay:
  lines w0.2: -15.5,8.1 15.5,8.1 ; -15.5,10.6 15.5,10.6 ; -15.02,12.074 ccw(c-13.748,13.347) -12.476,12.074 ; -15.02,15.077 cw(c-13.748,13.805) -12.476,15.077 ; -14.383,11.442 -15.018,12.077 -15.018,15.075 -14.383,15.71 -10.573,15.71 -9.938,15.075 -9.938,12.077 -10.573,11.442 ; -13.163,8.5 -12.763,8.5 ccw(c-12.763,8.9) -12.363,8.9 ccw(c-12.763,8.9) -12.763,9.3 cw(c-12.763,9.7) -13.163,9.7 cw(c-12.763,9.7) -12.763,10.1 -12.363,10.1 ; -12.48,12.074 ccw(c-11.208,13.347) -9.936,12.074 ; -12.48,15.077 cw(c-11.208,13.805) -9.936,15.077 ; -12.478,12.074 -12.478,15.075 ; -11.963,10.1 -11.963,9 ccw(c-11.463,9) -11.463,8.5 ccw(c-11.463,9.1) -10.863,9.1 -10.863,10.1 ; -10.463,9.3 -9.863,9.3 ; -9.9,-5 -9.9,8.1 ; -8.363,8.5 -8.363,10.1 cw(c-8.363,9.4) -7.663,9.4 -7.663,9.5 cw(c-7.063,9.5) -7.063,10.1 -7.063,8.5 ; -8.3,11.4 -8.3,16.9 cw(c-7.8,16.9) -7.8,17.4 7.8,17.4 cw(c7.8,16.9) 8.3,16.9 8.3,11.4 ; -6.563,8.5 -6.563,10.1 ; -6.063,8.5 -6.063,10.1 cw(c-6.063,9.2) -5.163,9.2 ; -5.163,8.5 -5.163,9.2 ; -5.163,10.1 -5.163,9.2 ; -4.663,8.5 -4.663,10.1 ; -4.263,8.5 -4.263,9.6 cw(c-3.763,9.6) -3.763,10.1 cw(c-3.763,9.5) -3.163,9.5 -3.163,8.5 ; -4.263,9.3 -3.163,9.3 ; -2.863,10.1 -1.863,10.1 ; -2.413,10.1 cw(c-2.413,10.05) -2.363,10.05 -2.363,8.5 ; -1.463,10.1 -1.463,9 ccw(c-0.963,9) -0.963,8.5 ccw(c-0.963,9.1) -0.363,9.1 -0.363,10.1 ; 0.037,8.5 0.037,10.1 0.637,10.1 cw(c0.637,9.7) 1.037,9.7 cw(c0.637,9.7) 0.637,9.3 ; 0.037,9.3 0.637,9.3 ; 1.037,8.5 1.037,8.9 ccw(c0.637,8.9) 0.637,9.3 ; 1.437,9.3 2.037,9.3 ; 2.037,8.5 1.437,8.5 1.437,10.1 2.037,10.1 ; 3.937,8.5 cw(c3.937,9.3) 3.137,9.3 ; 3.937,10.1 ccw(c3.937,9.3) 3.137,9.3 ; 5.737,8.5 5.737,10.1 cw(c5.737,9.2) 6.637,9.2 ; 6.637,8.5 6.637,9.2 ; 6.637,10.1 6.637,9.2 ; 7.037,8.5 7.037,10.1 cw(c7.037,9.2) 7.937,9.2 ; 7.937,8.5 7.937,9.2 ; 7.937,10.1 7.937,9.2 ; 8.337,9.3 8.937,9.3 ; 8.937,8.5 8.337,8.5 8.337,10.1 8.937,10.1 ; 9.9,-5 9.9,8.1 ; 9.957,12.074 ccw(c11.229,13.347) 12.501,12.074 ; 9.957,15.077 cw(c11.229,13.805) 12.501,15.077 ; 9.959,12.074 9.959,15.075 10.594,15.71 14.404,15.71 15.039,15.075 15.039,12.038 ; 9.959,12.077 10.594,11.442 ; 10.137,8.5 cw(c10.137,9.3) 9.337,9.3 cw(c10.137,9.3) 10.137,10.1 ; 10.537,10.1 11.537,10.1 ; 11.037,8.5 11.037,10.05 ; 12.497,12.074 ccw(c13.769,13.347) 15.041,12.074 ; 12.497,15.077 cw(c13.769,13.805) 15.041,15.077 ; 12.499,12.074 12.499,15.075 ; 13.337,8.5 13.337,10.1 13.937,10.1 cw(c13.937,9.7) 14.337,9.7 cw(c13.937,9.7) 13.937,9.3 ; 13.337,9.3 13.937,9.3 ; 14.337,8.5 14.337,8.9 ccw(c13.937,8.9) 13.937,9.3 ; 14.404,11.442 15.039,12.077 ; -9.863,9.3 cw(c-9.863,8.9) -9.463,8.9 cw(c-9.863,8.9) -9.863,8.5 -10.463,8.5 -10.463,10.1 -9.863,10.1 cw(c-9.863,9.7) -9.463,9.7 cw(c-9.863,9.7) -9.863,9.3 ; 3.137,9.3 3.137,9.3 ; -15.5,-5 15.5,-5 15.5,11.4 -15.5,11.4 -15.5,-5 ; -15.063,8.5 -15.063,10.1 -14.563,10.1 cw(c-14.563,9.6) -14.063,9.6 -14.063,9 cw(c-14.563,9) -14.563,8.5 -15.063,8.5 ; 4.137,9.1 ccw(c4.737,9.1) 4.737,8.5 ccw(c4.737,9.1) 5.337,9.1 5.337,9.5 ccw(c4.737,9.5) 4.737,10.1 ccw(c4.737,9.5) 4.137,9.5 4.137,9.1 ; 11.737,9.1 ccw(c12.337,9.1) 12.337,8.5 ccw(c12.337,9.1) 12.937,9.1 12.937,9.5 ccw(c12.337,9.5) 12.337,10.1 ccw(c12.337,9.5) 11.737,9.5 11.737,9.1
  text "5" at 6.35,-3.048 h1
  text "10" at 4.826,-0.508 h1
  text "15" at 6.35,2.032 h1
  text "11" at -7.366,2.032 h1
  text "6" at -7.874,-0.508 h1
  text "1" at -6.35,-3.048 h1
3D body "SW3dPS-vga connector.STEP": height 14.3, standoff -0.79, extent -16.725,14.097 16.963,59.227
3D body "connector_a-hdf_15_a-kg_t.stp": height 12.67, standoff -4.5, extent -15.42,-4.7 15.42,17.2

## DSUBHD_15RF_SMD [mm] "CONN, DSUB MINIATURE, NorComp 200-015-263R001 VGA"
height 12.6
pads (19):
  oval 0.3x3.5 smd mask+0.1: 1(-3.8,0) 2(-1.52,0) 3(0.76,0) 4(3.04,0) 5(5.32,0) 6(-5.32,0) 7(-3.04,0) 8(-0.76,0) 9(1.52,0) 10(3.8,0) 11(-4.56,0) 12(-2.28,0) 13(0,0) 14(2.28,0) 15(4.56,0)
  round 5 / inner round 3.3 / far side round 5 hole 3 mask+0.1: MH1(-12.5,0.3) MH2(12.5,0.3)
  round 1.8 hole 1.8 unplated: ""(-7.8,0.3) ""(7.8,0.3)
Top Overlay:
  lines w0.2: -15.02,4.244 ccw(c-13.748,5.517) -12.476,4.244 ; -15.02,7.847 cw(c-13.748,6.575) -12.476,7.847 ; -15,-0.8 -15.5,-0.8 -15.5,3.6 15.5,3.6 15.5,-0.8 15,-0.8 ; -14.383,3.612 -15.018,4.247 -15.018,7.845 -14.383,8.48 -10.573,8.48 -9.938,7.845 -9.938,4.247 -10.573,3.612 ; -12.48,4.244 ccw(c-11.208,5.517) -9.936,4.244 ; -12.48,7.847 cw(c-11.208,6.575) -9.936,7.847 ; -12.478,4.247 -12.478,7.845 ; -10,-0.8 -5.7,-0.8 ; -8.5,3.6 -8.5,8.5 cw(c-7.3,8.5) -7.3,9.7 7.3,9.7 cw(c7.3,8.5) 8.5,8.5 8.5,3.6 ; 5.7,-0.8 10,-0.8 ; 9.957,4.244 ccw(c11.229,5.517) 12.501,4.244 ; 9.957,7.847 cw(c11.229,6.575) 12.501,7.847 ; 10.594,3.612 9.959,4.247 9.959,7.845 10.594,8.48 14.404,8.48 15.039,7.845 15.039,4.247 14.404,3.612 ; 12.497,4.244 ccw(c13.769,5.517) 15.041,4.244 ; 12.497,7.847 cw(c13.769,6.575) 15.041,7.847 ; 12.499,4.247 12.499,7.845
  text "5" at 5.6,-2.4 h0.5
  text "15" at 4.8,-2.8 h0.5
  text "10" at 4.1,-2.8 h0.5
  text "4" at 3.3,-2.4 h0.5
  text "14" at 2.6,-2.8 h0.5
  text "9" at 1.8,-2.4 h0.5
  text "3" at 1,-2.4 h0.5
  text "13" at 0.3,-2.8 h0.5
  text "8" at -0.5,-2.4 h0.5
  text "2" at -1.3,-2.4 h0.5
  text "12" at -2,-2.8 h0.5
  text "7" at -2.7,-2.4 h0.5
  text "1" at -3.5,-2.4 h0.5
  text "11" at -4.3,-2.7 h0.5
  text "6" at -5,-2.4 h0.5
3D body "200-015-263.STEP": height 10.82, standoff -3.58, extent -15.436,-0.721 15.425,9.592